# Altium footprint library UZ_CarrierBoard.PcbLib: 91 footprints (part 4 of 6)
Each footprint in its own frame and in the unit in brackets; x right, y up, seen from the top. Pads: shape width x height; smd on the part's side, far side on the other; paste and mask are expansions set on the pad; w line width, h text height; cw(c..) or ccw(c..) is an arc to the next point about the centre after c.
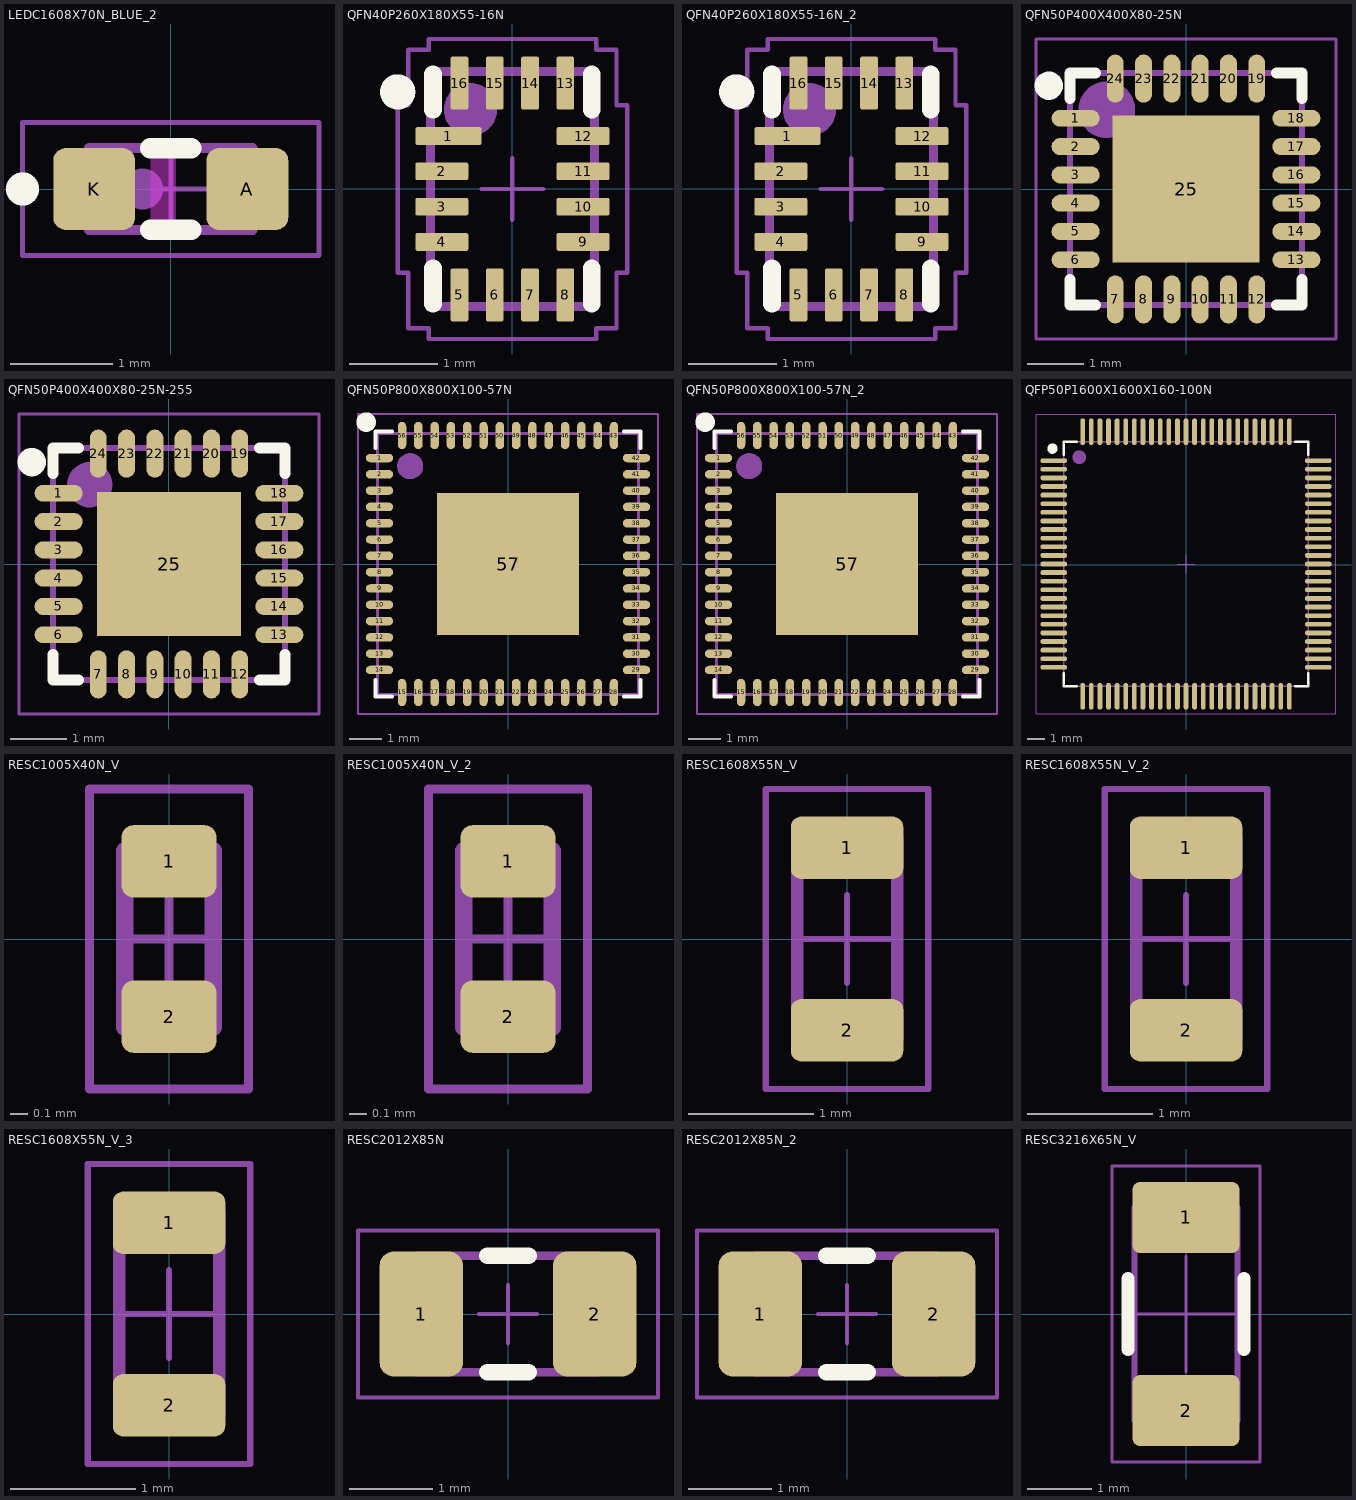
[diagram p3: the footprints below, top view; thin cyan lines are the x and y axes]

## LEDC1608X70N_BLUE_2 [mm]
pads (2):
  rrect30% 0.8x0.8 smd: A(0.75,0) K(-0.75,0)
Top Layer keep-out:
  rectangle: -0.2,-0.35 0.05,0.35
Top Overlay:
  circle w0.254: c-1.45,0 r0.035
  lines w0.2: -0.2,-0.4 0.2,-0.4 ; -0.2,0.4 0.2,0.4
Mechanical 13:
  circle w0.2: c-0.275,0 r0.1
  lines w0.1: -0.55,-0.4 -0.55,0.4 ; 0.55,-0.4 0.55,0.4 ; -0.8,-0.4 0.8,-0.4 0.8,0.4 -0.8,0.4 -0.8,-0.4
  text "K" at -1.025,0.35 h0.7
  text ".Designator" at 0.769,-0.68 h0.7
  text "A" at 0.968,0.362 h0.7
Mechanical 15:
  lines w0.05: -0.45,0 0.45,0 ; 0,-0.45 0,0.45 ; -1.45,-0.65 1.45,-0.65 1.45,0.65 -1.45,0.65 -1.45,-0.65
3D body "STP_150060xS75000_blue.STEP": height 0.7, standoff 0, extent -0.8,-0.4 0.8,0.4

## QFN40P260X180X55-16N [mm]
pads (16):
  rrect20% 0.75x0.2 smd: 1(-0.725,0.6)
  rrect20% 0.6x0.2 smd: 2(-0.8,0.2) 3(-0.8,-0.2) 4(-0.8,-0.6) 9(0.8,-0.6) 10(0.8,-0.2) 11(0.8,0.2) 12(0.8,0.6)
  rrect20% 0.2x0.6 smd: 5(-0.6,-1.2) 6(-0.2,-1.2) 7(0.2,-1.2) 8(0.6,-1.2) 13(0.6,1.2) 14(0.2,1.2) 15(-0.2,1.2) 16(-0.6,1.2)
Top Overlay:
  circle w0.2: c-1.3,1.1 r0.1
  lines w0.2: -0.9,-1.3 -0.9,-0.9 ; -0.9,0.9 -0.9,1.3 ; 0.9,-1.3 0.9,-0.9 ; 0.9,0.9 0.9,1.3
Mechanical 13:
  circle w0.3: c-0.475,0.9 r0.15
  lines w0.1: -0.93,-1.33 -0.93,1.33 0.93,1.33 0.93,-1.33 -0.93,-1.33
  text ".Designator" at 1.85,-1.5 h0.7
Mechanical 15:
  lines w0.05: -0.35,0 0.35,0 ; 0,-0.35 0,0.35 ; -1.3,-0.95 -1.3,0.95 -1.18,0.95 -1.18,1.58 -0.95,1.58 -0.95,1.7 0.95,1.7 0.95,1.58 1.18,1.58 1.18,0.95 1.3,0.95 1.3,-0.95 1.18,-0.95 1.18,-1.58 0.95,-1.58 0.95,-1.7 -0.95,-1.7 -0.95,-1.58 -1.18,-1.58 -1.18,-0.95 -1.3,-0.95
3D body: height 0.56, standoff 0, extent -0.7,0.7 -0.3,1.1
3D body: height 0.55, standoff 0.03, extent -0.93,-1.33 0.93,1.33

## QFN40P260X180X55-16N_2 [mm]
pads (16):
  rrect20% 0.75x0.2 smd: 1(-0.725,0.6)
  rrect20% 0.6x0.2 smd: 2(-0.8,0.2) 3(-0.8,-0.2) 4(-0.8,-0.6) 9(0.8,-0.6) 10(0.8,-0.2) 11(0.8,0.2) 12(0.8,0.6)
  rrect20% 0.2x0.6 smd: 5(-0.6,-1.2) 6(-0.2,-1.2) 7(0.2,-1.2) 8(0.6,-1.2) 13(0.6,1.2) 14(0.2,1.2) 15(-0.2,1.2) 16(-0.6,1.2)
Top Overlay:
  circle w0.2: c-1.3,1.1 r0.1
  lines w0.2: -0.9,-1.3 -0.9,-0.9 ; -0.9,0.9 -0.9,1.3 ; 0.9,-1.3 0.9,-0.9 ; 0.9,0.9 0.9,1.3
Mechanical 13:
  circle w0.3: c-0.475,0.9 r0.15
  lines w0.1: -0.93,-1.33 -0.93,1.33 0.93,1.33 0.93,-1.33 -0.93,-1.33
  text ".Designator" at 0.686,-1.168 h0.7
Mechanical 15:
  lines w0.05: -0.35,0 0.35,0 ; 0,-0.35 0,0.35 ; -1.3,-0.95 -1.3,0.95 -1.18,0.95 -1.18,1.58 -0.95,1.58 -0.95,1.7 0.95,1.7 0.95,1.58 1.18,1.58 1.18,0.95 1.3,0.95 1.3,-0.95 1.18,-0.95 1.18,-1.58 0.95,-1.58 0.95,-1.7 -0.95,-1.7 -0.95,-1.58 -1.18,-1.58 -1.18,-0.95 -1.3,-0.95
3D body: height 0.56, standoff 0, extent -0.698,0.7 -0.3,1.1
3D body: height 0.55, standoff 0.03, extent -0.93,-1.33 0.93,1.33

## QFN50P400X400X80-25N [mm]
pads (25):
  oval 0.85x0.3 smd: 1(-1.95,1.25) 2(-1.95,0.75) 3(-1.95,0.25) 4(-1.95,-0.25) 5(-1.95,-0.75) 6(-1.95,-1.25) 13(1.95,-1.25) 14(1.95,-0.75) 15(1.95,-0.25) 16(1.95,0.25) 17(1.95,0.75) 18(1.95,1.25)
  oval 0.3x0.85 smd: 7(-1.25,-1.95) 8(-0.75,-1.95) 9(-0.25,-1.95) 10(0.25,-1.95) 11(0.75,-1.95) 12(1.25,-1.95) 19(1.25,1.95) 20(0.75,1.95) 21(0.25,1.95) 22(-0.25,1.95) 23(-0.75,1.95) 24(-1.25,1.95)
  rect 2.6x2.6 smd: 25(0,0)
Top Overlay:
  circle w0.25: c-2.425,1.825 r0.125
  lines w0.2: -2.05,-1.6 -2.05,-2.05 -1.6,-2.05 ; -2.05,1.6 -2.05,2.05 -1.6,2.05 ; 1.6,-2.05 2.05,-2.05 2.05,-1.6 ; 1.6,2.05 2.05,2.05 2.05,1.6
Mechanical 13:
  circle w0.5: c-1.4,1.4 r0.25
  lines w0.1: -2.05,-2.05 2.05,-2.05 2.05,2.05 -2.05,2.05 -2.05,-2.05
  text ".Designator" at 0.852,0.289 h0.7
Mechanical 15:
  lines w0.05: -0.5,0 0.5,0 ; 0,-0.5 0,0.5 ; -2.65,-2.65 2.65,-2.65 2.65,2.65 -2.65,2.65 -2.65,-2.65
3D body: height 0.81, standoff 0.71, extent -1.648,1.151 -1.15,1.65
3D body: height 0.8, standoff 0, extent -2.05,-2.05 2.05,2.05

## QFN50P400X400X80-25N-255 [mm]
pads (25):
  oval 0.85x0.3 smd: 1(-1.95,1.25) 2(-1.95,0.75) 3(-1.95,0.25) 4(-1.95,-0.25) 5(-1.95,-0.75) 6(-1.95,-1.25) 13(1.95,-1.25) 14(1.95,-0.75) 15(1.95,-0.25) 16(1.95,0.25) 17(1.95,0.75) 18(1.95,1.25)
  oval 0.3x0.85 smd: 7(-1.25,-1.95) 8(-0.75,-1.95) 9(-0.25,-1.95) 10(0.25,-1.95) 11(0.75,-1.95) 12(1.25,-1.95) 19(1.25,1.95) 20(0.75,1.95) 21(0.25,1.95) 22(-0.25,1.95) 23(-0.75,1.95) 24(-1.25,1.95)
  rect 2.55x2.55 smd: 25(0,0)
Top Overlay:
  circle w0.25: c-2.425,1.8 r0.125
  lines w0.2: -2.05,-1.6 -2.05,-2.05 -1.6,-2.05 ; -2.05,1.6 -2.05,2.05 -1.6,2.05 ; 1.6,-2.05 2.05,-2.05 2.05,-1.6 ; 1.6,2.05 2.05,2.05 2.05,1.6
Mechanical 13:
  circle w0.4: c-1.4,1.4 r0.2
  lines w0.1: -2.05,-2.05 2.05,-2.05 2.05,2.05 -2.05,2.05 -2.05,-2.05
  text ".Designator" at -0.299,1.275 h1
Mechanical 15:
  lines w0.05: -0.5,0 0.5,0 ; 0,-0.5 0,0.5 ; -2.65,-2.65 2.65,-2.65 2.65,2.65 -2.65,2.65 -2.65,-2.65
3D body "User Library-QFN24-0_5.STEP": height 1, standoff 0, extent -2,-2 2,2

## QFN50P800X800X100-57N [mm]
pads (57):
  oval 0.84x0.26 smd: 1(-3.94,3.25) 2(-3.94,2.75) 3(-3.94,2.25) 4(-3.94,1.75) 5(-3.94,1.25) 6(-3.94,0.75) 7(-3.94,0.25) 8(-3.94,-0.25) 9(-3.94,-0.75) 10(-3.94,-1.25) 11(-3.94,-1.75) 12(-3.94,-2.25) 13(-3.94,-2.75) 14(-3.94,-3.25) 29(3.94,-3.25) 30(3.94,-2.75) 31(3.94,-2.25) 32(3.94,-1.75) 33(3.94,-1.25) 34(3.94,-0.75) 35(3.94,-0.25) 36(3.94,0.25) 37(3.94,0.75) 38(3.94,1.25) 39(3.94,1.75) 40(3.94,2.25) 41(3.94,2.75) 42(3.94,3.25)
  oval 0.26x0.84 smd: 15(-3.25,-3.94) 16(-2.75,-3.94) 17(-2.25,-3.94) 18(-1.75,-3.94) 19(-1.25,-3.94) 20(-0.75,-3.94) 21(-0.25,-3.94) 22(0.25,-3.94) 23(0.75,-3.94) 24(1.25,-3.94) 25(1.75,-3.94) 26(2.25,-3.94) 27(2.75,-3.94) 28(3.25,-3.94) 43(3.25,3.94) 44(2.75,3.94) 45(2.25,3.94) 46(1.75,3.94) 47(1.25,3.94) 48(0.75,3.94) 49(0.25,3.94) 50(-0.25,3.94) 51(-0.75,3.94) 52(-1.25,3.94) 53(-1.75,3.94) 54(-2.25,3.94) 55(-2.75,3.94) 56(-3.25,3.94)
  rect 4.37x4.37 smd: 57(0,0)
Top Overlay:
  circle w0.3: c-4.35,4.35 r0.15
  lines w0.12: -4.06,-3.56 -4.06,-4.06 -3.56,-4.06 ; -4.06,3.56 -4.06,4.06 -3.56,4.06 ; 3.56,-4.06 4.06,-4.06 4.06,-3.56 ; 3.56,4.06 4.06,4.06 4.06,3.56
Top Paste:
  region: 0.32,0.32 1.86,0.32 1.86,1.86 0.32,1.86
  region: -1.86,0.32 -0.32,0.32 -0.32,1.86 -1.86,1.86
  region: 0.32,-1.86 1.86,-1.86 1.86,-0.32 0.32,-0.32
  region: -1.86,-1.86 -0.32,-1.86 -0.32,-0.32 -1.86,-0.32
Mechanical 13:
  circle w0.4: c-3,3 r0.2
  lines w0.1: -4,-4 4,-4 4,4 -4,4 -4,-4
  text ".Designator" at 0.749,-1.438 h1
Mechanical 15:
  lines w0.05: -0.35,0 0.35,0 ; 0,-0.35 0,0.35 ; -4.6,-4.6 4.6,-4.6 4.6,4.6 -4.6,4.6 -4.6,-4.6
3D body "User Library-QFN56 (8x8).STEP": height 0.94, standoff -0.01, extent -4.015,-4.015 4.015,4.015

## QFN50P800X800X100-57N_2 [mm]
pads (57):
  oval 0.84x0.26 smd: 1(-3.94,3.25) 2(-3.94,2.75) 3(-3.94,2.25) 4(-3.94,1.75) 5(-3.94,1.25) 6(-3.94,0.75) 7(-3.94,0.25) 8(-3.94,-0.25) 9(-3.94,-0.75) 10(-3.94,-1.25) 11(-3.94,-1.75) 12(-3.94,-2.25) 13(-3.94,-2.75) 14(-3.94,-3.25) 29(3.94,-3.25) 30(3.94,-2.75) 31(3.94,-2.25) 32(3.94,-1.75) 33(3.94,-1.25) 34(3.94,-0.75) 35(3.94,-0.25) 36(3.94,0.25) 37(3.94,0.75) 38(3.94,1.25) 39(3.94,1.75) 40(3.94,2.25) 41(3.94,2.75) 42(3.94,3.25)
  oval 0.26x0.84 smd: 15(-3.25,-3.94) 16(-2.75,-3.94) 17(-2.25,-3.94) 18(-1.75,-3.94) 19(-1.25,-3.94) 20(-0.75,-3.94) 21(-0.25,-3.94) 22(0.25,-3.94) 23(0.75,-3.94) 24(1.25,-3.94) 25(1.75,-3.94) 26(2.25,-3.94) 27(2.75,-3.94) 28(3.25,-3.94) 43(3.25,3.94) 44(2.75,3.94) 45(2.25,3.94) 46(1.75,3.94) 47(1.25,3.94) 48(0.75,3.94) 49(0.25,3.94) 50(-0.25,3.94) 51(-0.75,3.94) 52(-1.25,3.94) 53(-1.75,3.94) 54(-2.25,3.94) 55(-2.75,3.94) 56(-3.25,3.94)
  rect 4.37x4.37 smd: 57(0,0)
Top Overlay:
  circle w0.3: c-4.35,4.35 r0.15
  lines w0.12: -4.06,-3.56 -4.06,-4.06 -3.56,-4.06 ; -4.06,3.56 -4.06,4.06 -3.56,4.06 ; 3.56,-4.06 4.06,-4.06 4.06,-3.56 ; 3.56,4.06 4.06,4.06 4.06,3.56
Top Paste:
  region: -1.86,-1.86 -0.32,-1.86 -0.32,-0.32 -1.86,-0.32
  region: 0.32,-1.86 1.86,-1.86 1.86,-0.32 0.32,-0.32
  region: -1.86,0.32 -0.32,0.32 -0.32,1.86 -1.86,1.86
  region: 0.32,0.32 1.86,0.32 1.86,1.86 0.32,1.86
Mechanical 13:
  circle w0.4: c-3,3 r0.2
  lines w0.1: -4,-4 -4,4 4,4 4,-4 -4,-4
  text ".Designator" at -0.5,-0.5 h1
Mechanical 15:
  lines w0.05: -0.35,0 0.35,0 ; 0,-0.35 0,0.35 ; -4.6,-4.6 -4.6,4.6 4.6,4.6 4.6,-4.6 -4.6,-4.6
3D body "User Library-QFN56 (8x8).STEP": height 0.94, standoff -0.01, extent -4.015,-4.015 4.015,4.015

## QFP50P1600X1600X160-100N [mm]
pads (100):
  oval 1.56x0.28 smd: 1(-7.68,6.05) 2(-7.68,5.55) 3(-7.68,5.05) 4(-7.68,4.55) 5(-7.68,4.05) 6(-7.68,3.55) 7(-7.68,3.05) 8(-7.68,2.55) 9(-7.68,2.05) 10(-7.68,1.55) 11(-7.68,1.05) 12(-7.68,0.55) 13(-7.68,0.05) 14(-7.68,-0.45) 15(-7.68,-0.95) 16(-7.68,-1.45) 17(-7.68,-1.95) 18(-7.68,-2.45) 19(-7.68,-2.95) 20(-7.68,-3.45) 21(-7.68,-3.95) 22(-7.68,-4.45) 23(-7.68,-4.95) 24(-7.68,-5.45) 25(-7.68,-5.95) 51(7.68,-5.95) 52(7.68,-5.45) 53(7.68,-4.95) 54(7.68,-4.45) 55(7.68,-3.95) 56(7.68,-3.45) 57(7.68,-2.95) 58(7.68,-2.45) 59(7.68,-1.95) 60(7.68,-1.45) 61(7.68,-0.95) 62(7.68,-0.45) 63(7.68,0.05) 64(7.68,0.55) 65(7.68,1.05) 66(7.68,1.55) 67(7.68,2.05) 68(7.68,2.55) 69(7.68,3.05) 70(7.68,3.55) 71(7.68,4.05) 72(7.68,4.55) 73(7.68,5.05) 74(7.68,5.55) 75(7.68,6.05)
  oval 0.28x1.56 smd: 26(-6,-7.63) 27(-5.5,-7.63) 28(-5,-7.63) 29(-4.5,-7.63) 30(-4,-7.63) 31(-3.5,-7.63) 32(-3,-7.63) 33(-2.5,-7.63) 34(-2,-7.63) 35(-1.5,-7.63) 36(-1,-7.63) 37(-0.5,-7.63) 38(0,-7.63) 39(0.5,-7.63) 40(1,-7.63) 41(1.5,-7.63) 42(2,-7.63) 43(2.5,-7.63) 44(3,-7.63) 45(3.5,-7.63) 46(4,-7.63) 47(4.5,-7.63) 48(5,-7.63) 49(5.5,-7.63) 50(6,-7.63) 76(6,7.73) 77(5.5,7.73) 78(5,7.73) 79(4.5,7.73) 80(4,7.73) 81(3.5,7.73) 82(3,7.73) 83(2.5,7.73) 84(2,7.73) 85(1.5,7.73) 86(1,7.73) 87(0.5,7.73) 88(0,7.73) 89(-0.5,7.73) 90(-1,7.73) 91(-1.5,7.73) 92(-2,7.73) 93(-2.5,7.73) 94(-3,7.73) 95(-3.5,7.73) 96(-4,7.73) 97(-4.5,7.73) 98(-5,7.73) 99(-5.5,7.73) 100(-6,7.73)
Top Overlay:
  circle w0.3: c-7.75,6.75 r0.15
  lines w0.12: -7.1,-6.27 -7.1,-7.05 -6.32,-7.05 ; -7.1,6.37 -7.1,7.15 -6.32,7.15 ; 6.32,-7.05 7.1,-7.05 7.1,-6.27 ; 6.32,7.15 7.1,7.15 7.1,6.37
Mechanical 13:
  circle w0.4: c-6.2,6.25 r0.2
  lines w0.1: -7.1,-7.05 -7.1,7.15 7.1,7.15 7.1,-7.05 -7.1,-7.05
  text ".Designator" at 1.27,0.234 h1
Mechanical 15:
  lines w0.05: -0.5,0.05 0.5,0.05 ; 0,-0.45 0,0.55 ; -8.71,-8.66 8.71,-8.66 8.71,8.76 -8.71,8.76 -8.71,-8.66
3D body "SW3dPS-LQFP100.STEP": height 1.6, standoff 0, extent -8,-8 8,8

## RESC1005X40N_V [mm]
pads (2):
  rrect33% 0.54x0.41 smd: 1(0,0.44) 2(0,-0.44)
Mechanical 13:
  lines w0.1: -0.25,-0.3 0.25,-0.3 ; -0.25,0.3 0.25,0.3 ; -0.25,-0.5 -0.25,0.5 0.25,0.5 0.25,-0.5 -0.25,-0.5
  text ".Designator" at 1.067,-1.194 h0.7
Mechanical 15:
  lines w0.05: -0.225,0 0.225,0 ; 0,-0.225 0,0.225 ; -0.45,-0.85 -0.45,0.85 0.45,0.85 0.45,-0.85 -0.45,-0.85
3D body "RESC1005X40L25.STEP": height 0.4, standoff 0, extent -0.25,-0.5 0.25,0.5

## RESC1005X40N_V_2 [mm]
pads (2):
  rrect33% 0.54x0.41 smd: 1(0,0.44) 2(0,-0.44)
Mechanical 13:
  lines w0.1: -0.25,-0.3 0.25,-0.3 ; -0.25,0.3 0.25,0.3 ; -0.25,-0.5 -0.25,0.5 0.25,0.5 0.25,-0.5 -0.25,-0.5
  text ".Designator" at 0.419,1.255 h0.7
Mechanical 15:
  lines w0.05: -0.225,0 0.225,0 ; 0,-0.225 0,0.225 ; -0.45,-0.85 -0.45,0.85 0.45,0.85 0.45,-0.85 -0.45,-0.85
3D body "RESC1005X40L25.STEP": height 0.4, standoff 0, extent -0.25,-0.5 0.25,0.5

## RESC1608X55N_V [mm]
pads (2):
  rrect33% 0.9x0.5 smd: 1(0,0.73) 2(0,-0.73)
Mechanical 13:
  lines w0.1: -0.4,-0.55 0.4,-0.55 ; -0.4,0.55 0.4,0.55 ; -0.4,-0.8 0.4,-0.8 0.4,0.8 -0.4,0.8 -0.4,-0.8
  text ".Designator" at 0.35,-3.5 h0.7
Mechanical 15:
  lines w0.05: -0.35,0 0.35,0 ; 0,-0.35 0,0.35 ; -0.65,-1.2 -0.65,1.2 0.65,1.2 0.65,-1.2 -0.65,-1.2
3D body "User Library-RESC1608X05N.STEP": height 0.45, standoff 0, extent -0.425,-0.775 0.425,0.775

## RESC1608X55N_V_2 [mm]
pads (2):
  rrect33% 0.9x0.5 smd: 1(0,0.73) 2(0,-0.73)
Mechanical 13:
  lines w0.1: -0.4,-0.55 0.4,-0.55 ; -0.4,0.55 0.4,0.55 ; -0.4,-0.8 0.4,-0.8 0.4,0.8 -0.4,0.8 -0.4,-0.8
  text ".Designator" at 0.553,0.848 h0.7
Mechanical 15:
  lines w0.05: -0.35,0 0.35,0 ; 0,-0.35 0,0.35 ; -0.65,-1.2 -0.65,1.2 0.65,1.2 0.65,-1.2 -0.65,-1.2
3D body "User Library-RESC1608X05N.STEP": height 0.45, standoff 0, extent -0.425,-0.775 0.425,0.775

## RESC1608X55N_V_3 [mm]
pads (2):
  rrect33% 0.9x0.5 smd: 1(0,0.73) 2(0,-0.73)
Mechanical 13:
  lines w0.1: -0.4,-0.55 0.4,-0.55 ; -0.4,0.55 0.4,0.55 ; -0.4,-0.8 0.4,-0.8 0.4,0.8 -0.4,0.8 -0.4,-0.8
  text ".Designator" at -1.301,0.822 h0.7
Mechanical 15:
  lines w0.05: -0.35,0 0.35,0 ; 0,-0.35 0,0.35 ; -0.65,-1.2 -0.65,1.2 0.65,1.2 0.65,-1.2 -0.65,-1.2
3D body "User Library-RESC1608X05N.STEP": height 0.45, standoff 0, extent -0.425,-0.775 0.425,0.775

## RESC2012X85N [mm]
pads (2):
  rrect33% 1x1.5 smd: 1(-1.04,0) 2(1.04,0)
Top Overlay:
  lines w0.2: -0.25,-0.7 0.25,-0.7 ; -0.25,0.7 0.25,0.7
Mechanical 13:
  lines w0.1: -0.6,-0.7 -0.6,0.7 ; 0.6,-0.7 0.6,0.7 ; -1.1,-0.7 -1.1,0.7 1.075,0.7 1.075,-0.7 -1.1,-0.7
  text ".Designator" at -1.6,-1.65 h0.7
Mechanical 15:
  lines w0.05: -0.35,0 0.35,0 ; 0,-0.35 0,0.35 ; -1.8,-1 -1.8,1 1.8,1 1.8,-1 -1.8,-1
3D body "User Library-MF-PSMF020X.step": height 0.48, standoff 0, extent -1,-0.6 1,0.6
3D body "User Library-MF-PSMF020X.step": height 0.83, standoff 0.35, extent -1,-0.6 1,0.6

## RESC2012X85N_2 [mm]
pads (2):
  rrect33% 1x1.5 smd: 1(-1.04,0) 2(1.04,0)
Top Overlay:
  lines w0.2: -0.25,-0.7 0.25,-0.7 ; -0.25,0.7 0.25,0.7
Mechanical 13:
  lines w0.1: -0.6,-0.7 -0.6,0.7 ; 0.6,-0.7 0.6,0.7 ; -1.1,-0.7 -1.1,0.7 1.075,0.7 1.075,-0.7 -1.1,-0.7
  text ".Designator" at 1.581,0.166 h0.7
Mechanical 15:
  lines w0.05: -0.35,0 0.35,0 ; 0,-0.35 0,0.35 ; -1.8,-1 -1.8,1 1.8,1 1.8,-1 -1.8,-1
3D body "User Library-MF-PSMF020X.step": height 0.48, standoff 0, extent -1,-0.6 1,0.6
3D body "User Library-MF-PSMF020X.step": height 0.83, standoff 0.35, extent -1,-0.6 1,0.6

## RESC3216X65N_V [mm]
pads (2):
  rrect20% 1.66x1.1 smd: 1(0,1.5) 2(0,-1.5)
Top Overlay:
  lines w0.2: -0.9,-0.55 -0.9,0.55 ; 0.9,-0.55 0.9,0.55
Mechanical 13:
  lines w0.1: -0.8,-1.1 0.8,-1.1 ; -0.8,1.1 0.8,1.1 ; -0.8,-1.65 0.8,-1.65 0.8,1.65 -0.8,1.65 -0.8,-1.65
  text ".Designator" at 1.057,1.224 h0.7
Mechanical 15:
  lines w0.05: -0.9,0 0,0 ; 0,-0.9 0,0 ; 0,0.9 0,0 ; 0.9,0 0,0 ; -1.15,-2.3 -1.15,0 -1.15,2.3 1.15,2.3 1.15,-2.3 -1.15,-2.3
3D body "RESC3216X60L45.STEP": height 0.6, standoff 0, extent -0.8,-1.625 0.8,1.625